# Altium footprint library StandardCase.PcbLib: 200 footprints (part 3 of 13)
Each footprint in its own frame and in the unit in brackets; x right, y up, seen from the top. Pads: shape width x height; smd on the part's side, far side on the other; paste and mask are expansions set on the pad; w line width, h text height; cw(c..) or ccw(c..) is an arc to the next point about the centre after c.
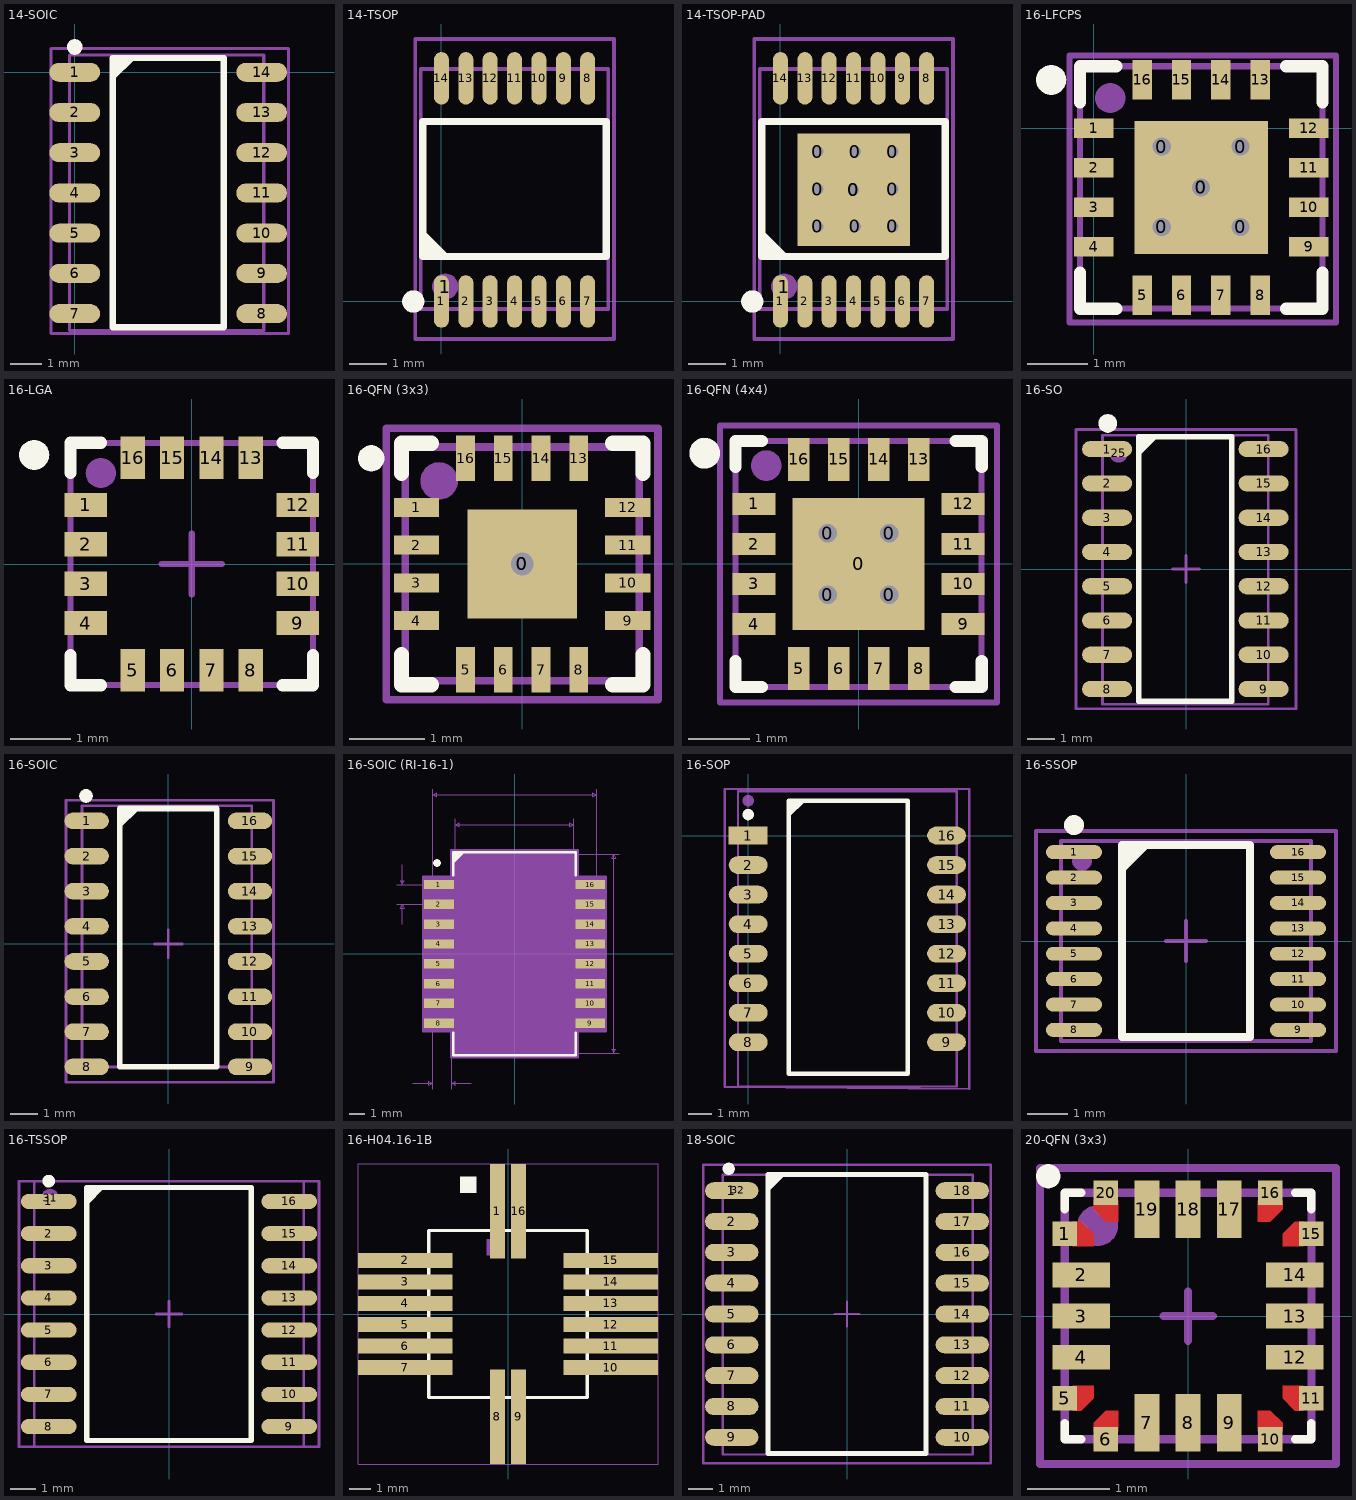
[diagram p2: the footprints below, top view; thin cyan lines are the x and y axes]

## 14-SOIC [mm] "pitch 1.27 mm"
pads (16):
  rrect100% 1.6x0.6 smd: 1(0,0) 2(0,-1.27) 3(0,-2.54) 4(0,-3.81) 5(0,-5.08) 6(0,-6.35) 7(0,-7.62) 8(5.9,-7.62) 9(5.9,-6.35) 10(5.9,-5.08) 11(5.9,-3.81) 12(5.9,-2.54) 13(5.9,-1.27) 14(5.9,0)
  rrect100% 0.5x0.5 on Top Overlay: ""(0,0.8)
  round 0.5 on Mech1: ""(0.5,0)
Top Overlay:
  region: 1.2,0.45 1.2,-0.27 1.92,0.45
  lines w0.2: 1.2,-8.05 4.7,-8.05 4.7,0.45 1.2,0.45 1.2,-8.05
Top Assy:
  lines w0.1: -0.168,-8.15 -0.168,0.55 5.969,0.55 5.969,-8.15 -0.168,-8.15
Border:
  lines w0.1: -0.75,-8.25 -0.75,0.75 6.75,0.75 6.75,0.5 6.75,-8.25 -0.75,-8.25
3D body "User Library-so14-2.STEP": height 1.78, standoff 0.01, extent -0.118,-8.15 6.019,0.55

## 14-TSOP [mm]
pads (16):
  rrect100% 0.4x1.4 smd: 1(0,0) 2(0.65,0) 3(1.3,0) 4(1.95,0) 5(2.6,0) 6(3.25,0) 7(3.9,0) 8(3.9,5.95) 9(3.25,5.95) 10(2.6,5.95) 11(1.95,5.95) 12(1.3,5.95) 13(0.65,5.95) 14(0,5.95)
  round 0.7 on Mech1: 1(0.1,0.4)
  round 0.6 on Top Overlay: ""(-0.75,0)
Top Overlay:
  region: -0.5,1.2 0.22,1.2 -0.5,1.92
  lines w0.2: -0.5,1.2 4.4,1.2 4.4,4.8 -0.5,4.8 -0.5,1.2
Top Assy:
  lines w0.1: -0.55,6.2 -0.55,6.2 ; -0.55,6.2 4.45,6.2 4.45,-0.2 -0.55,-0.2 -0.55,6.2
Border:
  lines w0.1: -0.7,-1 -0.7,7 4.6,7 4.6,2.4 4.6,-1 -0.7,-1
3D body "SW3dPS-TSSOP14-1.STEP": height 1.1, standoff 0, extent -0.55,-0.2 4.45,6.2

## 14-TSOP-PAD [mm] "pitch 0.65 mm, power pad"
pads (26):
  round 0.7 hole 0.3: 0(1,2) 0(1,3) 0(1,4) 0(1.95,2.975) 0(2,2) 0(2,4) 0(3,2) 0(3,3) 0(3,4)
  rect 3x3 smd: 0(1.95,2.975)
  rrect100% 0.4x1.4 smd: 1(0,0) 2(0.65,0) 3(1.3,0) 4(1.95,0) 5(2.6,0) 6(3.25,0) 7(3.9,0) 8(3.9,5.95) 9(3.25,5.95) 10(2.6,5.95) 11(1.95,5.95) 12(1.3,5.95) 13(0.65,5.95) 14(0,5.95)
  round 0.7 on Mech1: 1(0.1,0.4)
  round 0.6 on Top Overlay: ""(-0.75,0)
Top Overlay:
  region: -0.5,1.2 0.22,1.2 -0.5,1.92
  lines w0.2: -0.5,1.2 -0.5,4.8 4.4,4.8 4.4,1.2 -0.5,1.2
Top Assy:
  lines w0.1: -0.55,6.2 -0.55,-0.2 4.45,-0.2 4.45,6.2 -0.55,6.2 ; -0.55,6.2 -0.55,6.2
Border:
  lines w0.1: -0.7,-1 4.6,-1 4.6,2.4 4.6,7 -0.7,7 -0.7,-1
3D body "SW3dPS-TSSOP14-1.STEP": height 1.1, standoff 0, extent -0.55,-0.2 4.45,6.2

## 16-LFCPS [mm] "4x4 mm, pitch 0.65 mm"
height 0.9
pads (24):
  round 0.7 hole 0.3: 0(1.125,-1.625) 0(1.125,-0.3) 0(1.775,-0.975) 0(2.425,-1.625) 0(2.425,-0.3)
  rect 2.2x2.2 smd: 0(1.775,-0.975)
  rect 0.65x0.32 smd: 1(0,0) 2(0,-0.65) 3(0,-1.3) 4(0,-1.95) 9(3.55,-1.95) 10(3.55,-1.3) 11(3.55,-0.65) 12(3.55,0)
  rect 0.32x0.65 smd: 5(0.8,-2.75) 6(1.45,-2.75) 7(2.1,-2.75) 8(2.75,-2.75) 13(2.75,0.8) 14(2.1,0.8) 15(1.45,0.8) 16(0.8,0.8)
  round 0.5 on Top Overlay: ""(-0.7,0.8)
  round 0.5 on Mech1: ""(0.275,0.5)
Top Overlay:
  lines w0.2: -0.225,-2.375 -0.225,-2.975 0.375,-2.975 ; -0.225,0.425 -0.225,1.025 0.375,1.025 ; 3.175,-2.975 3.775,-2.975 3.775,-2.375 ; 3.175,1.025 3.775,1.025 3.775,0.425
Top Assy:
  lines w0.1: -0.225,-2.975 3.775,-2.975 3.775,1.025 -0.225,1.025 -0.225,-2.975
Border:
  lines w0.1: -0.4,-3.2 -0.4,1.2 4,1.2 4,-3.2 -0.4,-3.2
3D body "User Library-qfn16-4x4No pad.STEP": height 0.92, standoff 0, extent -0.225,-2.975 3.775,1.025

## 16-LGA [mm] "4x4 mm, pitch 0.65 mm"
height 1
pads (18):
  rect 0.7x0.4 smd: 1(-1.75,0.975) 2(-1.75,0.325) 3(-1.75,-0.325) 4(-1.75,-0.975) 9(1.75,-0.975) 10(1.75,-0.325) 11(1.75,0.325) 12(1.75,0.975)
  rect 0.4x0.7 smd: 5(-0.975,-1.75) 6(-0.325,-1.75) 7(0.325,-1.75) 8(0.975,-1.75) 13(0.975,1.75) 14(0.325,1.75) 15(-0.325,1.75) 16(-0.975,1.75)
  round 0.5 on Top Overlay: ""(-2.6,1.8)
  round 0.5 on Mech1: ""(-1.5,1.5)
Top Overlay:
  lines w0.2: -2,-1.5 -2,-2 -1.5,-2 ; -2,1.5 -2,2 -1.5,2 ; 1.5,-2 2,-2 2,-1.5 ; 1.5,2 2,2 2,1.5
Top Assy:
  lines w0.1: -2,-2 2,-2 2,2 -2,2 -2,-2
Border:
  lines w0.1: -0.5,0 0.5,0 ; 0,-0.5 0,0.5 ; -2,-2 2,-2 2,2 -2,2 -2,-2
3D body "User Library-LGA-16.step": height 0.98, standoff 0, extent -2,-2 2,2

## 16-QFN (3x3) [mm] "3x3 mm, pitch 0.5 mm"
height 0.75
pads (20):
  rect 1.45x1.45 smd: 0(0,0)
  round 0.7 hole 0.3: 0(0,0)
  rect 0.6x0.25 smd: 1(-1.4,0.75) 2(-1.4,0.25) 3(-1.4,-0.25) 4(-1.4,-0.75) 9(1.4,-0.75) 10(1.4,-0.25) 11(1.4,0.25) 12(1.4,0.75)
  rect 0.25x0.6 smd: 5(-0.75,-1.4) 6(-0.25,-1.4) 7(0.25,-1.4) 8(0.75,-1.4) 13(0.75,1.4) 14(0.25,1.4) 15(-0.25,1.4) 16(-0.75,1.4)
  round 0.35 on Top Overlay: ""(-2,1.4)
  round 0.5 on Mech1: ""(-1.1,1.1)
Top Overlay:
  lines w0.2: -1.6,-1.2 -1.6,-1.6 -1.2,-1.6 ; -1.6,1.2 -1.6,1.6 -1.2,1.6 ; 1.2,-1.6 1.6,-1.6 1.6,-1.2 ; 1.2,1.6 1.6,1.6 1.6,1.2
Top Assy:
  lines w0.1: -1.55,-1.55 1.55,-1.55 1.55,1.55 -1.55,1.55 -1.55,-1.55
Border:
  lines w0.1: -0.2,0 0.2,0 ; 0,-0.2 0,0.2 ; -1.8,-1.8 -1.8,1.8 1.8,1.8 1.8,-1.8 -1.8,-1.8
3D body "User Library-QFN-16.STEP": height 0.9, standoff 0, extent -1.501,-1.501 1.501,1.501

## 16-QFN (4x4) [mm] "4x4 mm, pitch 0.65 mm"
height 0.75
pads (22):
  round 0.7 hole 0.3: 0(-0.5,-0.5) 0(-0.5,0.5) 0(0.5,-0.5) 0(0.5,0.5)
  rect 2.15x2.15 smd: 0(0,0)
  rect 0.7x0.35 smd: 1(-1.7,0.975) 2(-1.7,0.325) 3(-1.7,-0.325) 4(-1.7,-0.975) 9(1.7,-0.975) 10(1.7,-0.325) 11(1.7,0.325) 12(1.7,0.975)
  rect 0.35x0.7 smd: 5(-0.975,-1.7) 6(-0.325,-1.7) 7(0.325,-1.7) 8(0.975,-1.7) 13(0.975,1.7) 14(0.325,1.7) 15(-0.325,1.7) 16(-0.975,1.7)
  round 0.5 on Mech1: ""(-1.5,1.6)
Top Overlay:
  circle w0.25: c-2.5,1.8 r0.125
  lines w0.2: -2,-1.575 -2,-2 -1.575,-2 ; -2,1.575 -2,2 -1.575,2 ; 1.575,-2 2,-2 2,-1.575 ; 1.575,2 2,2 2,1.575
Top Assy:
  lines w0.1: -2,-2 2,-2 2,2 -2,2 -2,-2
Border:
  lines w0.1: -0.5,0 0.5,0 ; 0,-0.5 0,0.5 ; -2.25,-2.25 2.25,-2.25 2.25,2.25 -2.25,2.25 -2.25,-2.25
3D body "16-QFN (4x4).step": height 0.75, standoff 0, extent -2,-2 2,2

## 16-SO [mm] "pitch 1.27 mm"
height 2.65
pads (18):
  oval 1.85x0.6 smd: 1(-2.925,4.448) 2(-2.925,3.178) 3(-2.925,1.908) 4(-2.925,0.638) 5(-2.925,-0.632) 6(-2.925,-1.902) 7(-2.925,-3.172) 8(-2.925,-4.442) 9(2.875,-4.442) 10(2.875,-3.172) 11(2.875,-1.902) 12(2.875,-0.632) 13(2.875,0.638) 14(2.875,1.908) 15(2.875,3.178) 16(2.875,4.448)
  round 0.7 on Mech1: 25(-2.5,4.3)
  round 0.7 on Top Overlay: ""(-2.9,5.4)
Top Overlay:
  region: -1.75,4.9 -1.75,4.18 -1.03,4.9
  lines w0.2: -1.75,-4.9 1.7,-4.9 1.7,4.9 -1.75,4.9 -1.75,-4.9
Top Assy:
  lines w0.1: -3.093,-5.01 3.044,-5.01 3.044,4.96 -3.093,4.96 -3.093,-5.01
Border:
  lines w0.1: -0.499,0.003 0.501,0.003 ; 0.001,-0.497 0.001,0.503 ; -4.075,-5.175 4.075,-5.175 4.075,5.175 -4.075,5.175 -4.075,-5.175
3D body "User Library-so16-1.STEP": height 1.73, standoff -0.04, extent -3.093,-5.01 3.044,4.96

## 16-SOIC [mm] "pitch 1.27 mm"
height 1.75
pads (18):
  rrect100% 1.6x0.6 smd: 1(-2.95,4.445) 2(-2.95,3.175) 3(-2.95,1.905) 4(-2.95,0.635) 5(-2.95,-0.635) 6(-2.95,-1.905) 7(-2.95,-3.175) 8(-2.95,-4.445) 9(2.95,-4.445) 10(2.95,-3.175) 11(2.95,-1.905) 12(2.95,-0.635) 13(2.95,0.635) 14(2.95,1.905) 15(2.95,3.175) 16(2.95,4.445)
  rrect100% 0.5x0.5 on Top Overlay: ""(-2.975,5.35)
  round 0.5 on Mech1: ""(-2.45,4.445)
Top Overlay:
  region: -1.75,4.895 -1.75,4.175 -1.03,4.895
  lines w0.2: -1.75,-4.445 -1.75,4.895 1.75,4.895 1.75,-4.445 -1.75,-4.445
Top Assy:
  lines w0.1: -3.118,-4.445 3.019,-4.445 3.019,4.995 -3.118,4.995 -3.118,-4.445
Border:
  lines w0.1: -0.5,0 0.5,0 ; 0,-0.5 0,0.5 ; -3.7,-5.005 3.8,-5.005 3.8,4.945 3.8,5.195 -3.7,5.195 -3.7,-5.005
3D body "User Library-SOIC-16-1.STEP": height 1.4, standoff 0, extent -3,-4.95 3,4.95

## 16-SOIC (RI-16-1) [mm] "Case RI-16-1 (AD); 12.75mmx10.31mm"
height 2.54
pads (18):
  rect 1.9x0.6 smd: 1(-4.85,4.445) 2(-4.85,3.175) 3(-4.85,1.905) 4(-4.85,0.635) 5(-4.85,-0.635) 6(-4.85,-1.905) 7(-4.85,-3.175) 8(-4.85,-4.445) 9(4.85,-4.445) 10(4.85,-3.175) 11(4.85,-1.905) 12(4.85,-0.635) 13(4.85,0.635) 14(4.85,1.905) 15(4.85,3.175) 16(4.85,4.445)
  rrect100% 0.5x0.5 on Top Overlay: ""(-4.975,5.825)
  round 0.5 on Mech1: ""(-3.2,5.8)
Top Overlay:
  region: -3.927,6.502 -3.927,5.782 -3.207,6.502
  lines w0.152: -3.927,-5.038 -3.927,-6.502 3.927,-6.502 3.927,-5.038 ; -3.927,5.038 -3.927,6.502 3.927,6.502 3.927,5.038
Top Assy:
  lines w0: -0.305,6.375 ccw(c0,6.375) 0.305,6.375
  lines w0.025: -5.255,-4.675 -3.8,-4.675 -3.8,-4.215 -5.255,-4.215 -5.255,-4.675 ; -5.255,-3.405 -3.8,-3.405 -3.8,-2.945 -5.255,-2.945 -5.255,-3.405 ; -5.255,-2.135 -3.8,-2.135 -3.8,-1.675 -5.255,-1.675 -5.255,-2.135 ; -5.255,-0.865 -3.8,-0.865 -3.8,-0.405 -5.255,-0.405 -5.255,-0.865 ; -5.255,0.405 -3.8,0.405 -3.8,0.865 -5.255,0.865 -5.255,0.405 ; -5.255,1.675 -3.8,1.675 -3.8,2.135 -5.255,2.135 -5.255,1.675 ; -5.255,2.945 -3.8,2.945 -3.8,3.405 -5.255,3.405 -5.255,2.945 ; -5.255,4.215 -3.8,4.215 -3.8,4.675 -5.255,4.675 -5.255,4.215 ; -3.8,-6.375 -3.8,6.375 3.8,6.375 3.8,-6.375 -3.8,-6.375 ; 3.8,-4.675 5.255,-4.675 5.255,-4.215 3.8,-4.215 3.8,-4.675 ; 3.8,-3.405 5.255,-3.405 5.255,-2.945 3.8,-2.945 3.8,-3.405 ; 3.8,-2.135 5.255,-2.135 5.255,-1.675 3.8,-1.675 3.8,-2.135 ; 3.8,-0.865 5.255,-0.865 5.255,-0.405 3.8,-0.405 3.8,-0.865 ; 3.8,0.405 5.255,0.405 5.255,0.865 3.8,0.865 3.8,0.405 ; 3.8,1.675 5.255,1.675 5.255,2.135 3.8,2.135 3.8,1.675 ; 3.8,2.945 5.255,2.945 5.255,3.405 3.8,3.405 3.8,2.945 ; 3.8,4.215 5.255,4.215 5.255,4.675 3.8,4.675 3.8,4.215
Mechanical 7:
  lines w0.025: -7.571,3.175 -4.65,3.175 ; -7.571,4.445 -4.65,4.445 ; -7.19,1.905 -7.19,3.175 ; -7.19,5.715 -7.19,4.445 ; -6.525,-8.28 -5.255,-8.28 ; -5.255,-8.661 -5.255,0 -5.255,10.566 ; -4.045,-8.661 -4.045,0 ; -3.8,0 -3.8,8.661 ; -2.775,-8.28 -4.045,-8.28 ; 0,-6.375 6.721,-6.375 ; 0,6.375 6.721,6.375 ; 3.8,0 3.8,8.661 ; 5.255,0 5.255,10.566 ; -7.19,3.175 -7.063,2.921 -7.317,2.921 -7.19,3.175 ; -7.19,4.445 -7.063,4.699 -7.317,4.699 -7.19,4.445 ; -5.255,-8.28 -5.509,-8.407 -5.509,-8.153 -5.255,-8.28 ; -5.255,10.185 -5.001,10.058 -5.001,10.312 -5.255,10.185 ; -5.255,10.185 5.255,10.185 ; -4.045,-8.28 -3.791,-8.407 -3.791,-8.153 -4.045,-8.28 ; -3.8,8.28 -3.546,8.153 -3.546,8.407 -3.8,8.28 ; -3.8,8.28 3.8,8.28 ; 3.8,8.28 3.546,8.153 3.546,8.407 3.8,8.28 ; 5.255,10.185 5.001,10.058 5.001,10.312 5.255,10.185 ; 6.34,-6.375 6.467,-6.121 6.213,-6.121 6.34,-6.375 ; 6.34,-6.375 6.34,6.375 ; 6.34,6.375 6.467,6.121 6.213,6.121 6.34,6.375
  text "0.04in/1.01mm" at -6.714,-9.423 h0.64
  text "0.05in/1.27mm" at -11.826,3.492 h0.64
  text "0.502in/12.75mm" at 6.848,-0.318 h0.64
  text "0.414in/10.51mm" at -2.381,10.693 h0.64
  text "0.299in/7.6mm" at -2.064,8.788 h0.64
  text "Alt 2 Padstyle: b229_152h76" at -8.572,-19.075 h1.27
  text "Alt 1 Padstyle: b152_229h76" at -8.572,-17.551 h1.27
  text "Pin One Padstyle: r191_52" at -7.938,-12.979 h1.27
  text "Default Padstyle: r191_52" at -7.938,-11.455 h1.27
Border:
  region: -4.054,-4.959 -5.859,-4.959 -5.859,4.959 -4.054,4.959 -4.054,6.629 4.054,6.629 4.054,4.959 5.859,4.959 5.859,-4.959 4.054,-4.959 4.054,-6.629 -4.054,-6.629
  lines w0.152: -5.859,-4.959 -4.054,-4.959 -4.054,-6.629 4.054,-6.629 4.054,-4.959 5.859,-4.959 5.859,4.959 4.054,4.959 4.054,6.629 -4.054,6.629 -4.054,4.959 -5.859,4.959 -5.859,-4.959
3D body "RI_16_1.step": height 2.64, standoff 0, extent -5.3,-6.525 5.35,6.475
3D body: height 0.25, standoff 0, extent 0,0 0.254,0.254

## 16-SOP [mm] "pitch 1.27 mm"
pads (18):
  rect 1.67x0.76 smd: 1(0,0)
  oval 1.67x0.76 smd: 2(0,-1.27) 3(0,-2.54) 4(0,-3.81) 5(0,-5.08) 6(0,-6.35) 7(0,-7.62) 8(0,-8.89) 9(8.53,-8.89) 10(8.53,-7.62) 11(8.53,-6.35) 12(8.53,-5.08) 13(8.53,-3.81) 14(8.53,-2.54) 15(8.53,-1.27) 16(8.53,0)
  round 0.5 on Top Overlay: ""(0,0.9)
  round 0.5 on Mech1: ""(0,1.5)
Top Overlay:
  region: 1.75,1.5 1.75,0.78 2.47,1.5
  lines w0.2: 4.583,1.5 6.86,1.5 6.86,-10.25 1.75,-10.25 1.75,1.5 6,1.5
Top Assy:
  lines w0.1: -0.435,-10.795 -0.435,1.905 8.965,1.905 8.965,-10.795 -0.435,-10.795
Border:
  lines w0.1: -1,-10.8 -1,2 9.5,2 9.5,-10.9 -1,-10.8
3D body "User Library-smt4.step": height 5.1, standoff 0, extent -0.435,-10.795 8.965,1.905

## 16-SSOP [mm] "pitch 0.635 mm"
height 1.75
pads (17):
  oval 1.4x0.35 smd: 1(-2.8,2.222) 2(-2.8,1.587) 3(-2.8,0.953) 4(-2.8,0.318) 5(-2.8,-0.318) 6(-2.8,-0.953) 7(-2.8,-1.587) 8(-2.8,-2.222) 9(2.8,-2.222) 10(2.8,-1.587) 11(2.8,-0.953) 12(2.8,-0.318) 13(2.8,0.318) 14(2.8,0.953) 15(2.8,1.587) 16(2.8,2.222)
  round 0.5 on Mech1: ""(-2.6,2)
Top Overlay:
  circle w0.25: c-2.8,2.9 r0.125
  region: -1.6,2.4 -1.6,1.68 -0.88,2.4
  lines w0.2: -1.6,-2.4 1.6,-2.4 1.6,2.4 -1.6,2.4 -1.6,-2.4
Top Assy:
  lines w0.1: -3.127,-2.5 3.126,-2.5 3.126,2.5 -3.127,2.5 -3.127,-2.5
Border:
  lines w0.1: -0.5,0 0.5,0 ; 0,-0.5 0,0.5 ; -3.75,-2.75 3.75,-2.75 3.75,2.75 -3.75,2.75 -3.75,-2.75
3D body "ssop16.step": height 1.73, standoff -0.01, extent -3.127,-2.5 3.126,2.5

## 16-TSSOP [mm] "pitch 1.27 mm"
height 2.65
pads (17):
  oval 2.2x0.6 smd: 1(-4.75,4.445) 2(-4.75,3.175) 3(-4.75,1.905) 4(-4.75,0.635) 5(-4.75,-0.635) 6(-4.75,-1.905) 7(-4.75,-3.175) 8(-4.75,-4.445) 9(4.75,-4.445) 10(4.75,-3.175) 11(4.75,-1.905) 12(4.75,-0.635) 13(4.75,0.635) 14(4.75,1.905) 15(4.75,3.175) 16(4.75,4.445)
  round 0.7 on Mech1: 31(-4.7,4.6)
Top Overlay:
  circle w0.25: c-4.75,5.25 r0.125
  region: -3.25,5 -3.25,4.28 -2.53,5
  lines w0.2: -3.25,-5 3.25,-5 3.25,5 -3.25,5 -3.25,-5
Top Assy:
  lines w0.1: -5.315,-5.25 -5.315,5.25 5.315,5.25 5.315,-5.25 -5.315,-5.25
Border:
  lines w0.1: -0.5,0 0.5,0 ; 0,-0.5 0,0.5 ; -5.925,-5.25 -5.925,5.25 5.925,5.25 5.925,-5.25 -5.925,-5.25
3D body "User Library-SOIC16_Wide_JEDEC_MS-013AA.STEP": height 2.62, standoff -0.03, extent -5.315,-5.25 5.315,5.25

## 16-Н04.16-1B [mm] "USSR"
height 3
pads (16):
  rect 0.7x4.4 smd mask+0.1: 1(-0.5,4.8) 8(-0.5,-4.8) 9(0.5,-4.8) 16(0.5,4.8)
  rect 4.4x0.7 smd mask+0.1: 2(-4.8,2.5) 3(-4.8,1.5) 4(-4.8,0.5) 5(-4.8,-0.5) 6(-4.8,-1.5) 7(-4.8,-2.5) 10(4.8,-2.5) 11(4.8,-1.5) 12(4.8,-0.5) 13(4.8,0.5) 14(4.8,1.5) 15(4.8,2.5)
Top Overlay:
  region: -2.225,5.65 -1.475,5.65 -1.475,6.4 -2.225,6.4
  lines w0.15: -4.775,-2.5 -3.7,-2.5 ; -4.775,-1.5 -3.7,-1.5 ; -4.775,-0.5 -3.7,-0.5 ; -4.775,0.5 -3.7,0.5 ; -4.775,1.5 -3.7,1.5 ; -4.775,2.5 -3.7,2.5 ; -0.5,-4.775 -0.5,-3.9 ; -0.5,3.9 -0.5,4.8 ; 0.5,-4.775 0.5,-3.9 ; 0.5,3.9 0.5,4.8 ; 3.7,-2.5 4.775,-2.5 ; 3.7,-1.5 4.775,-1.5 ; 3.7,-0.5 4.775,-0.5 ; 3.7,0.5 4.775,0.5 ; 3.7,1.5 4.775,1.5 ; 3.7,2.5 4.775,2.5 ; -3.7,-3.9 3.7,-3.9 3.7,3.9 -3.7,3.9 -3.7,-3.9
Top Assy:
  region: -1,2.75 -0.25,2.75 -0.25,3.5 -1,3.5
  lines w0.05: -7,-2.5 -3.7,-2.5 ; -7,-1.5 -3.7,-1.5 ; -7,-0.5 -3.7,-0.5 ; -7,0.5 -3.7,0.5 ; -7,1.5 -3.7,1.5 ; -7,2.5 -3.7,2.5 ; -0.5,-7 -0.5,-3.9 ; -0.5,3.9 -0.5,7 ; 0.5,-7 0.5,-3.9 ; 0.5,3.9 0.5,7 ; 3.7,-2.5 7,-2.5 ; 3.7,-1.5 7,-1.5 ; 3.7,-0.5 7,-0.5 ; 3.7,0.5 7,0.5 ; 3.7,1.5 7,1.5 ; 3.7,2.5 7,2.5 ; -3.7,-3.9 3.7,-3.9 3.7,3.9 -3.7,3.9 -3.7,-3.9
Mechanical 11:
  text ".Designator" at -3.025,-0.35 h1.4
Mechanical 16:
  lines w0.05: -7,-7 7,-7 7,7 -7,7 -7,-7
3D body "Н04.16-1В.STEP": height 2.92, standoff 0, extent -7.84,-8 7.84,8

## 18-SOIC [mm] "pitch 1.27 mm"
height 2.65
pads (19):
  oval 2.2x0.7 smd: 1(-4.75,5.08) 2(-4.75,3.81) 3(-4.75,2.54) 4(-4.75,1.27) 5(-4.75,0) 6(-4.75,-1.27) 7(-4.75,-2.54) 8(-4.75,-3.81) 9(-4.75,-5.08) 10(4.75,-5.08) 11(4.75,-3.81) 12(4.75,-2.54) 13(4.75,-1.27) 14(4.75,0) 15(4.75,1.27) 16(4.75,2.54) 17(4.75,3.81) 18(4.75,5.08)
  round 0.7 on Mech1: 32(-4.5,5.1)
Top Overlay:
  region: -3.25,5.75 -3.25,5.03 -2.53,5.75
  lines w0.2: -3.25,-5.75 3.25,-5.75 3.25,5.75 -3.25,5.75 -3.25,-5.75
  lines w0.25: -4.75,6 ccw(c-4.874,5.983) -4.749,5.983
Top Assy:
  lines w0.1: -5.125,-5.79 5.175,-5.79 5.175,5.74 -5.125,5.74 -5.125,-5.79
Border:
  lines w0.1: -0.5,0 0.5,0 ; 0,-0.5 0,0.5 ; -5.925,-6.15 5.925,-6.15 5.925,6.15 -5.925,6.15 -5.925,-6.15
3D body "SW3dPS-SOIC18-300.STEP": height 2.65, standoff 0, extent -5.125,-5.79 5.175,5.74

## 20-QFN (3x3) [mm] "3x3 mm, pitch 0.5 mm"
pads (22):
  rect 0.3x0.3 smd: 1(-1.5,1) 5(-1.5,-1) 6(-1,-1.5) 10(1,-1.5) 11(1.5,-1) 15(1.5,1) 16(1,1.5) 20(-1,1.5)
  rect 0.7x0.3 smd: 2(-1.3,0.5) 3(-1.3,0) 4(-1.3,-0.5) 12(1.3,-0.5) 13(1.3,0) 14(1.3,0.5)
  rect 0.3x0.7 smd: 7(-0.5,-1.3) 8(0,-1.3) 9(0.5,-1.3) 17(0.5,1.3) 18(0,1.3) 19(-0.5,1.3)
  round 0.3 on Top Overlay: ""(-1.7,1.7)
  round 0.5 on Mech1: ""(-1.1,1.1)
Top Layer:
  region: -1.4,1.15 -1.3,1.15 -1.15,1 -1.15,0.85 -1.4,0.85
  region: -1.15,1.4 -1.15,1.3 -1,1.15 -0.85,1.15 -0.85,1.4
  region: 1.4,1.15 1.3,1.15 1.15,1 1.15,0.85 1.4,0.85
  region: 1.15,1.4 1.15,1.3 1,1.15 0.85,1.15 0.85,1.4
  region: -1.4,-1.15 -1.3,-1.15 -1.15,-1 -1.15,-0.85 -1.4,-0.85
  region: -1.15,-1.4 -1.15,-1.3 -1,-1.15 -0.85,-1.15 -0.85,-1.4
  region: 1.15,-1.4 1.15,-1.3 1,-1.15 0.85,-1.15 0.85,-1.4
  region: 1.4,-1.15 1.3,-1.15 1.15,-1 1.15,-0.85 1.4,-0.85
Top Overlay:
  lines w0.1: -1.5,-1.3 -1.5,-1.5 -1.3,-1.5 ; -1.5,1.3 -1.5,1.5 -1.3,1.5 ; 1.3,-1.5 1.5,-1.5 1.5,-1.3 ; 1.3,1.5 1.5,1.5 1.5,1.3
Top Solder:
  region: 0.75,-0.85 0.85,-0.85 0.85,-0.75 1.25,-0.75 1.25,-1.25 0.75,-1.25
  region: -0.75,-0.85 -0.85,-0.85 -0.85,-0.75 -1.25,-0.75 -1.25,-1.25 -0.75,-1.25
  region: -0.75,0.85 -0.85,0.85 -0.85,0.75 -1.25,0.75 -1.25,1.25 -0.75,1.25
  region: 0.75,0.85 0.85,0.85 0.85,0.75 1.25,0.75 1.25,1.25 0.75,1.25
Top Assy:
  lines w0.1: -1.5,-1.5 -1.5,1.5 1.5,1.5 1.5,-1.5 -1.5,-1.5
Border:
  lines w0.1: -0.3,0 0.3,0 ; 0,-0.3 0,0.3 ; -1.8,-1.8 -1.8,1.8 1.8,1.8 1.8,-1.8 -1.8,-1.8
3D body "User Library-UFQFPN20-1.STEP": height 0.55, standoff 0, extent -1.5,-1.5 1.5,1.5